# Altium footprint library myPcbLib.PcbLib: 987 footprints (part 4 of 62)
Each footprint in its own frame and in the unit in brackets; x right, y up, seen from the top. Pads: shape width x height; smd on the part's side, far side on the other; paste and mask are expansions set on the pad; w line width, h text height; cw(c..) or ccw(c..) is an arc to the next point about the centre after c.
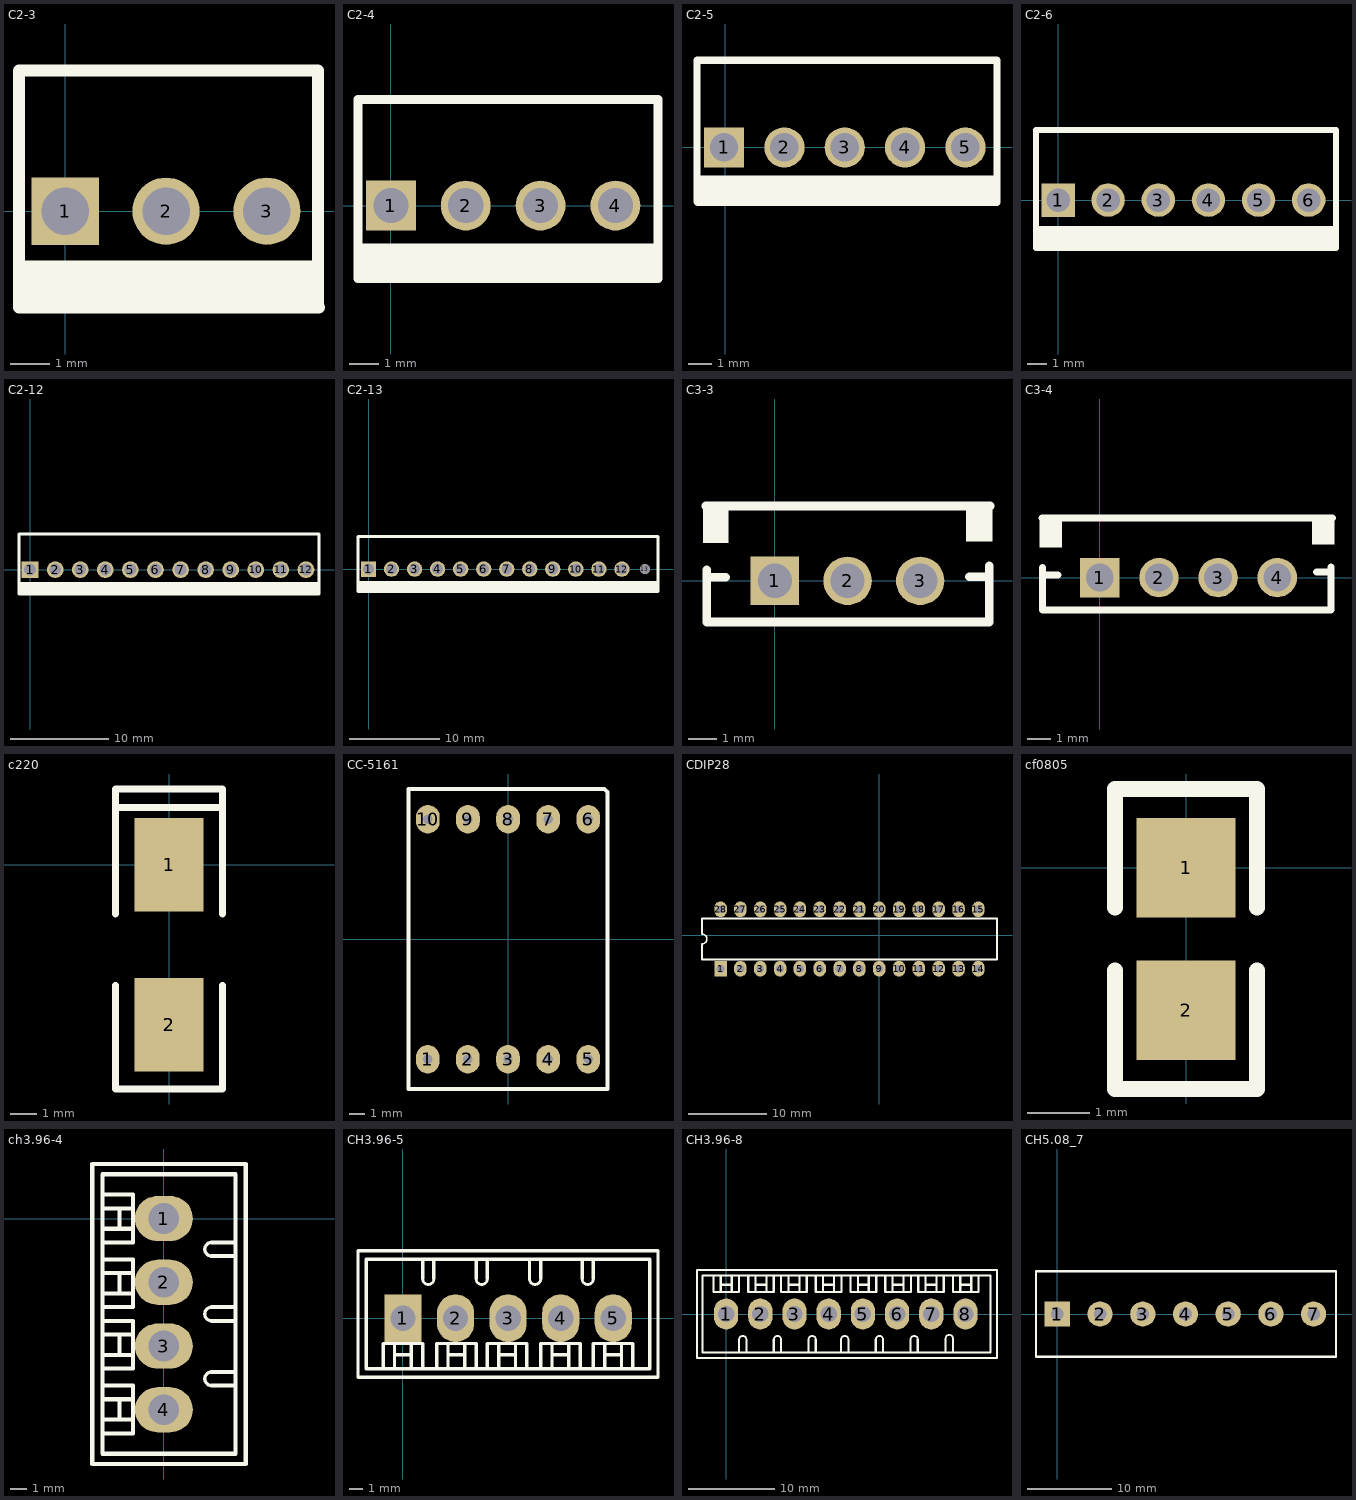
[diagram p3: the footprints below, top view; thin cyan lines are the x and y axes]

## C2-3 [mm]
pads (3):
  rect 1.7x1.7 hole 1.2: 1(0,0)
  round 1.7 hole 1.2: 2(2.55,0) 3(5.1,0)
Top Overlay:
  region: 6.355,-1.247 -1.159,-1.247 -1.159,-2.443 6.355,-2.443
  lines w0.305: 6.398,-2.421 6.398,3.563 -1.169,3.563 -1.169,-2.443 6.419,-2.443

## C2-4 [mm]
pads (4):
  rect 1.7x1.7 hole 1.2: 1(0,0)
  round 1.7 hole 1.2: 2(2.55,0) 3(5.1,0) 4(7.65,0)
Top Overlay:
  region: 9.059,-1.289 -1.079,-1.289 -1.079,-2.464 9.059,-2.464
  lines w0.305: 9.102,-2.485 -1.122,-2.485 -1.122,3.611 9.102,3.611 9.102,-2.474

## C2-5 [mm]
pads (5):
  rect 1.7x1.7 hole 1.2: 1(-0.047,-0.015)
  round 1.7 hole 1.2: 2(2.503,-0.015) 3(5.053,-0.015) 4(7.603,-0.015) 5(10.153,-0.015)
Top Overlay:
  region: -1.168,-1.203 -1.168,-2.341 11.452,-2.341 11.452,-1.203
  lines w0.305: -1.19,-2.309 -1.19,3.67 11.489,3.67 11.489,-2.341 -1.168,-2.341

## C2-6 [mm]
pads (6):
  rect 1.7x1.7 hole 1.2: 1(0,0)
  round 1.7 hole 1.2: 2(2.55,0) 3(5.1,0) 4(7.65,0) 5(10.2,0) 6(12.75,0)
Top Overlay:
  region: 14.118,-1.321 -1.101,-1.321 -1.101,-2.379 14.118,-2.379
  lines w0.305: 14.129,-2.443 -1.122,-2.443 -1.122,3.579 14.139,3.579 14.139,-2.421

## C2-12 [mm]
pads (12):
  rect 1.7x1.7 hole 1.2: 1(0,0)
  round 1.7 hole 1.2: 2(2.55,0) 3(5.1,0) 4(7.65,0) 5(10.2,0) 6(12.75,0) 7(15.3,0) 8(17.85,0) 9(20.4,0) 10(22.95,0) 11(25.5,0) 12(28.05,0)
Top Overlay:
  region: 29.363,-1.278 -1.127,-1.278 -1.127,-2.464 29.363,-2.464
  lines w0.305: 29.353,-2.496 -1.117,-2.496 -1.117,3.643 29.374,3.643 29.374,-2.4

## C2-13 [mm]
pads (13):
  rect 1.7x1.7 hole 1.2: 1(0,0)
  round 1.7 hole 1.2: 2(2.55,0) 3(5.1,0) 4(7.65,0) 5(10.2,0) 6(12.75,0) 7(15.3,0) 8(17.85,0) 9(20.4,0) 10(22.95,0) 11(25.5,0) 12(28.05,0)
  round 1.1 hole 1.1: 13(30.6,0)
Top Overlay:
  region: 32.004,-1.316 -1.132,-1.316 -1.132,-2.448 32.004,-2.448
  lines w0.305: 32.036,-2.464 -1.164,-2.464 -1.164,3.6 32.046,3.6 32.046,-2.4

## C3-3 [mm]
pads (3):
  rect 1.7x1.7 hole 1.2: 1(0,0)
  round 1.7 hole 1.2: 2(2.55,0) 3(5.1,0)
Top Overlay:
  region: -2.529,2.637 -2.529,1.325 -1.63,1.325 -1.63,2.637
  region: 6.71,2.627 6.71,1.378 7.631,1.378 7.631,2.627
  lines w0.305: -2.424,2.627 7.556,2.627 ; -2.392,0.383 -2.392,-1.448 7.525,-1.448 7.525,0.531 ; -2.371,0.129 -1.725,0.129 ; 6.816,0.14 7.44,0.14

## C3-4 [mm]
pads (4):
  rect 1.7x1.7 hole 1.2: 1(0,0)
  round 1.7 hole 1.2: 2(2.55,0) 3(5.1,0) 4(7.65,0)
Top Overlay:
  region: 9.144,2.542 9.144,1.431 10.107,1.431 10.107,2.542
  region: -2.593,2.574 -2.593,1.293 -1.63,1.293 -1.63,2.574
  lines w0.305: -2.498,2.574 10.033,2.574 ; -2.476,0.425 -2.476,-1.405 9.97,-1.405 9.97,0.447 ; -2.455,0.119 -1.81,0.119 ; 9.335,0.246 9.97,0.246

## c220 [mm]
height 4
pads (2):
  rect 2.6x3.5 smd: 1(0,0) 2(0,-6)
Top Overlay:
  lines w0.254: -2,-4.524 -2,-8.407 2,-8.407 2,-4.524 ; -2,-1.857 -2,2.829 2,2.829 2,-1.857 ; -2,2.134 2,2.134

## CC-5161 [mm]
height 6
pads (10):
  oval 1.5x1.8 hole 0.6: 1(-5.083,-7.603) 2(-2.543,-7.603) 3(-0.003,-7.603) 4(2.537,-7.603) 5(5.077,-7.603) 6(5.083,7.603) 7(2.543,7.603) 8(0.003,7.603) 9(-2.537,7.603) 10(-5.077,7.603)
Top Overlay:
  lines w0.254: -6.303,-9.483 -6.303,9.517 6.093,9.517 6.297,9.313 6.297,-3.083 6.297,-9.483 -6.303,-9.483

## CDIP28 [mm]
height 6
pads (28):
  rect 1.6x2 hole 1: 1(-20.32,-4.318)
  oval 1.6x2 hole 1: 2(-17.78,-4.318) 3(-15.24,-4.318) 4(-12.7,-4.318) 5(-10.16,-4.318) 6(-7.62,-4.318) 7(-5.08,-4.318) 8(-2.54,-4.318) 9(0,-4.318) 10(2.54,-4.318) 11(5.08,-4.318) 12(7.62,-4.318) 13(10.16,-4.318) 14(12.7,-4.318) 15(12.7,3.302) 16(10.16,3.302) 17(7.62,3.302) 18(5.08,3.302) 19(2.54,3.302) 20(0,3.302) 21(-2.54,3.302) 22(-5.08,3.302) 23(-7.62,3.302) 24(-10.16,3.302) 25(-12.7,3.302) 26(-15.24,3.302) 27(-17.78,3.302) 28(-20.32,3.302)
Top Overlay:
  lines w0.2: -22.71,-1.143 ccw(c-22.71,-0.508) -22.71,0.127
  lines w0.254: -22.71,-1.143 -22.71,-3.158 15.09,-3.158 15.09,2.142 -22.71,2.142 -22.71,0.127

## cf0805 [mm]
height 4
pads (2):
  rect 1.6x1.6 smd: 1(0,0) 2(0,-2.286)
Top Overlay:
  lines w0.254: -1.143,-1.651 -1.143,-3.556 1.143,-3.556 1.143,-1.651 ; -1.143,-0.635 -1.143,1.27 1.143,1.27 1.143,-0.635

## ch3.96-4 [mm]
pads (4):
  oval 3.6x2.8 hole 1.9: 1(0,0) 2(0,-3.958) 3(0,-7.916) 4(0,-11.874)
Top Overlay:
  lines w0.203: 2.963,-10.372 cw(c2.963,-9.948) 2.963,-9.525 ; 2.963,-6.35 cw(c2.963,-5.927) 2.963,-5.503 ; 2.963,-2.328 cw(c2.963,-1.905) 2.963,-1.482
  lines w0.254: -3.81,-13.335 -1.905,-13.335 -1.905,-10.372 -3.81,-10.372 ; -3.81,-12.488 -1.905,-12.488 ; -3.81,-11.218 -1.905,-11.218 ; -3.81,-9.313 -1.905,-9.313 -1.905,-6.35 -3.81,-6.35 ; -3.81,-8.467 -1.905,-8.467 ; -3.81,-7.197 -1.905,-7.197 ; -3.81,-5.503 -1.905,-5.503 -1.905,-2.54 -3.81,-2.54 ; -3.81,-4.657 -1.905,-4.657 ; -3.81,-3.387 -1.905,-3.387 ; -3.81,-1.482 -1.905,-1.482 -1.905,1.482 -3.81,1.482 ; -3.81,-0.635 -1.905,-0.635 ; -3.81,0.635 -1.905,0.635 ; -2.752,-12.488 -2.752,-11.218 ; -2.752,-8.467 -2.752,-7.197 ; -2.752,-4.657 -2.752,-3.387 ; -2.752,-0.635 -2.752,0.635 ; 2.963,-10.372 4.445,-10.372 ; 2.963,-9.525 4.445,-9.525 ; 2.963,-6.35 4.445,-6.35 ; 2.963,-5.503 4.445,-5.503 ; 2.963,-2.328 4.445,-2.328 ; 2.963,-1.482 4.445,-1.482 ; -4.445,-15.24 5.08,-15.24 5.08,3.387 -4.445,3.387 -4.445,-15.24 ; -3.81,-14.605 4.445,-14.605 4.445,2.752 -3.81,2.752 -3.81,-14.605

## CH3.96-5 [mm]
height 10
pads (5):
  rect 2.8x3.6 hole 1.9: 1(0,0)
  oval 2.8x3.6 hole 1.9: 2(3.958,0) 3(7.916,0) 4(11.875,0) 5(15.833,0)
Top Overlay:
  lines w0.203: 1.482,2.963 ccw(c1.905,2.963) 2.328,2.963 ; 5.503,2.963 ccw(c5.927,2.963) 6.35,2.963 ; 9.525,2.963 ccw(c9.948,2.963) 10.372,2.963 ; 13.483,2.963 ccw(c13.906,2.963) 14.33,2.963
  lines w0.254: -1.482,-3.81 -1.482,-1.905 1.482,-1.905 1.482,-3.81 ; -0.635,-3.81 -0.635,-1.905 ; -0.635,-2.752 0.635,-2.752 ; 0.635,-3.81 0.635,-1.905 ; 1.482,2.963 1.482,4.445 ; 2.328,2.963 2.328,4.445 ; 2.54,-3.81 2.54,-1.905 5.503,-1.905 5.503,-3.81 ; 3.387,-3.81 3.387,-1.905 ; 3.387,-2.752 4.657,-2.752 ; 4.657,-3.81 4.657,-1.905 ; 5.503,2.963 5.503,4.445 ; 6.35,-3.81 6.35,-1.905 9.313,-1.905 9.313,-3.81 ; 6.35,2.963 6.35,4.445 ; 7.197,-3.81 7.197,-1.905 ; 7.197,-2.752 8.467,-2.752 ; 8.467,-3.81 8.467,-1.905 ; 9.525,2.963 9.525,4.445 ; 10.372,-3.81 10.372,-1.905 13.335,-1.905 13.335,-3.81 ; 10.372,2.963 10.372,4.445 ; 11.218,-3.81 11.218,-1.905 ; 11.218,-2.752 12.488,-2.752 ; 12.488,-3.81 12.488,-1.905 ; 13.483,2.963 13.483,4.445 ; 14.33,-3.81 14.33,-1.905 17.293,-1.905 17.293,-3.81 ; 14.33,2.963 14.33,4.445 ; 15.176,-3.81 15.176,-1.905 ; 15.176,-2.752 16.446,-2.752 ; 16.446,-3.81 16.446,-1.905 ; -3.387,-4.445 19.198,-4.445 19.198,5.08 -3.387,5.08 -3.387,-4.445 ; -2.752,-3.81 18.563,-3.81 18.563,4.445 -2.752,4.445 -2.752,-3.81

## CH3.96-8 [mm]
height 10
pads (8):
  oval 2.8x3.6 hole 1.9: 1(0,0) 2(3.96,0) 3(7.92,0) 4(11.88,0) 5(15.84,0) 6(19.8,0) 7(23.76,0) 8(27.72,0)
Top Overlay:
  lines w0.203: 1.503,-2.963 cw(c1.926,-2.963) 2.349,-2.963 ; 5.525,-2.963 cw(c5.948,-2.963) 6.371,-2.963 ; 9.546,-2.963 cw(c9.97,-2.963) 10.393,-2.963 ; 13.314,-2.963 cw(c13.737,-2.963) 14.16,-2.963 ; 17.336,-2.963 cw(c17.759,-2.963) 18.182,-2.963 ; 21.357,-2.963 cw(c21.78,-2.963) 22.204,-2.963 ; 25.421,-2.836 cw(c25.845,-2.836) 26.268,-2.836
  lines w0.254: -1.46,4.445 -1.46,2.54 1.503,2.54 1.503,4.445 ; -0.614,2.54 -0.614,4.445 ; -0.614,3.387 0.656,3.387 ; 0.656,2.54 0.656,4.445 ; 1.503,-4.445 1.503,-2.963 ; 2.349,-4.445 2.349,-2.963 ; 2.561,4.445 2.561,2.54 5.524,2.54 5.524,4.445 ; 3.408,2.54 3.408,4.445 ; 3.408,3.387 4.678,3.387 ; 4.678,2.54 4.678,4.445 ; 5.524,-4.445 5.524,-2.963 ; 6.371,-4.445 6.371,-2.963 ; 6.371,4.445 6.371,2.54 9.335,2.54 9.335,4.445 ; 7.218,2.54 7.218,4.445 ; 7.218,3.387 8.488,3.387 ; 8.445,-5.08 31.369,-5.08 31.369,5.08 12.509,5.08 ; 8.488,2.54 8.488,4.445 ; 9.08,-4.445 30.607,-4.445 30.607,4.445 ; 9.546,-4.445 9.546,-2.963 ; 10.393,-4.445 10.393,-2.963 ; 10.393,4.445 10.393,2.54 13.356,2.54 13.356,4.445 ; 11.239,2.54 11.239,4.445 ; 11.239,3.387 12.509,3.387 ; 12.509,2.54 12.509,4.445 ; 13.144,4.445 30.501,4.445 ; 13.314,-4.445 13.314,-2.963 ; 14.16,-4.445 14.16,-2.963 ; 14.414,4.445 14.414,2.54 17.378,2.54 17.378,4.445 ; 14.626,-4.445 -2.73,-4.445 -2.73,4.445 14.626,4.445 ; 15.261,-5.08 -3.365,-5.08 -3.365,5.08 15.261,5.08 ; 15.261,2.54 15.261,4.445 ; 15.261,3.387 16.531,3.387 ; 16.531,2.54 16.531,4.445 ; 17.335,-4.445 17.335,-2.963 ; 18.182,-4.445 18.182,-2.963 ; 18.436,4.445 18.436,2.54 21.399,2.54 21.399,4.445 ; 19.283,2.54 19.283,4.445 ; 19.283,3.387 20.553,3.387 ; 20.553,2.54 20.553,4.445 ; 21.357,-4.445 21.357,-2.963 ; 22.204,-4.445 22.204,-2.963 ; 22.246,4.445 22.246,2.54 25.209,2.54 25.209,4.445 ; 23.093,2.54 23.093,4.445 ; 23.093,3.387 24.363,3.387 ; 24.363,2.54 24.363,4.445 ; 25.421,-4.318 25.421,-2.836 ; 26.268,-4.318 26.268,-2.836 ; 26.268,4.445 26.268,2.54 29.231,2.54 29.231,4.445 ; 27.114,2.54 27.114,4.445 ; 27.114,3.387 28.384,3.387 ; 28.384,2.54 28.384,4.445

## CH5.08_7 [mm]
height 10
pads (7):
  rect 3x3 hole 1.5: 1(0,0)
  round 3 hole 1.5: 2(5.08,0) 3(10.16,0) 4(15.24,0) 5(20.32,0) 6(25.4,0) 7(30.48,0)
Top Overlay:
  lines w0.254: 22.86,-5.08 33.147,-5.08 33.147,5.08 22.86,5.08 ; 33.02,-5.08 -2.54,-5.08 -2.54,5.08 33.02,5.08